# Altium footprint library connector.PcbLib: 207 footprints (part 5 of 13)
Each footprint in its own frame and in the unit in brackets; x right, y up, seen from the top. Pads: shape width x height; smd on the part's side, far side on the other; paste and mask are expansions set on the pad; w line width, h text height; cw(c..) or ccw(c..) is an arc to the next point about the centre after c.
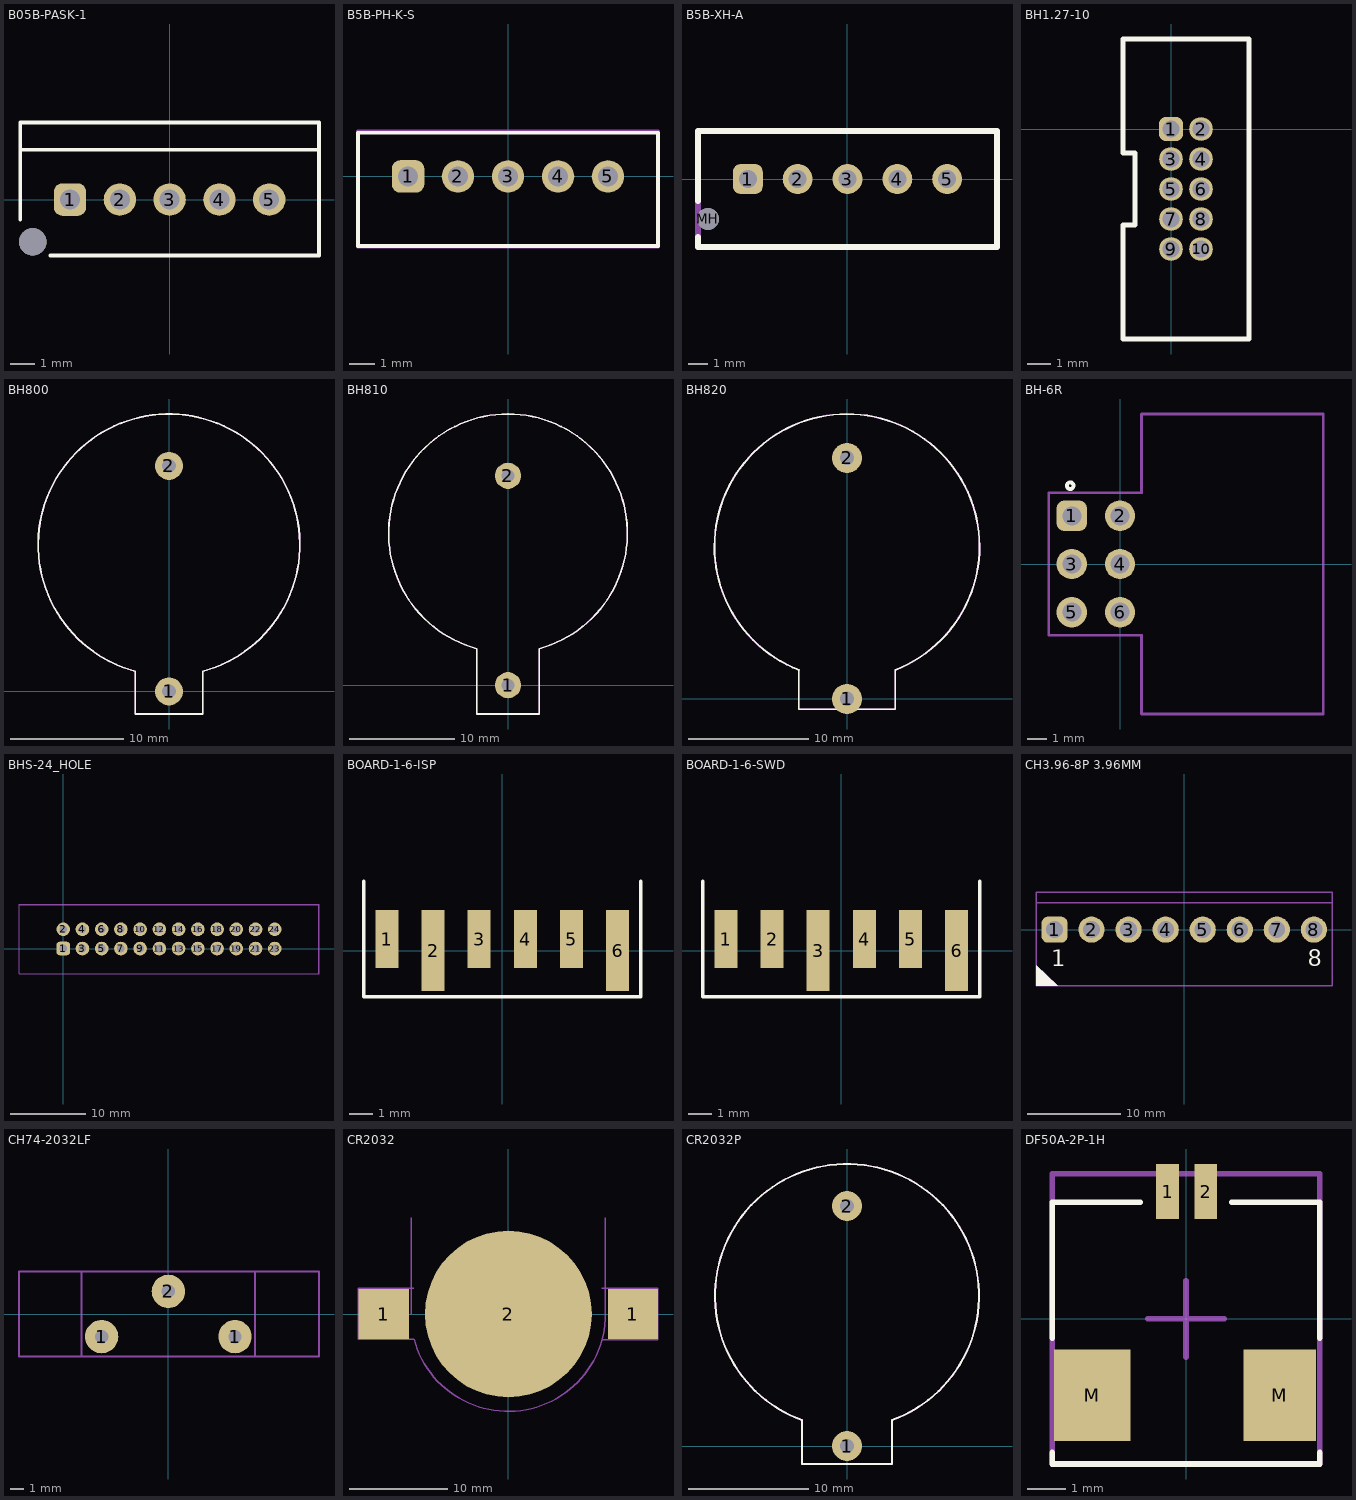
[diagram p4: the footprints below, top view; thin cyan lines are the x and y axes]

## B05B-PASK-1 [mm]
pads (6):
  rrect50% 1.3x1.3 hole 0.8: 1(-4,0)
  round 1.3 hole 0.8: 2(-2,0) 3(0,0) 4(2,0) 5(4,0)
  round 1.1 hole 1.1 unplated: ""(-5.5,-1.7)
Top Overlay:
  lines w0.15: -6,-0.8 -6,2 ; -4.8,-2.25 6,-2.25 6,2 ; -6,2 -6,3.1 0,3.1 6,3.1 6,2 ; -6,2 6,2
  text "." at -5,2.5 h0.1
3D body "B05B-PASK-1.STEP": height 7.85, standoff -2.85, extent -6,-2.2 6,3.1

## B5B-PH-K-S [mm]
pads (5):
  rrect50% 1.3x1.3 hole 0.8: 1(-4,0)
  round 1.3 hole 0.8: 2(-2,0) 3(0,0) 4(2,0) 5(4,0)
Top Overlay:
  lines w0.15: -6,-2.775 -6,1.75 6,1.75 6,-2.775 -6,-2.775
Top Courtyard:
  lines w0.15: -6,-2.8 6,-2.8 6,1.8 -6,1.8 -6,-2.8
3D body "B5B-PH-K-S.STEP": height 6, standoff -3.4, extent -5.95,-2.75 5.95,1.75

## B5B-XH-A [mm]
pads (6):
  rrect50% 1.5x1.5 hole 0.9: 1(-5,0)
  round 1.5 hole 0.9: 2(-2.5,0) 3(0,0) 4(2.5,0) 5(5,0)
  round 1.1 hole 1.1 unplated: MH(-7,-2)
Top Overlay:
  lines w0.3: -7.5,-2.9 -7.5,-3.4 7.5,-3.4 7.5,2.4 -7.5,2.4 -7.5,-1.1
Top Courtyard:
  lines w0.3: -7.5,-3.4 7.5,-3.4 7.5,2.4 -7.5,2.4 -7.5,-3.4
3D body "B5B-XH-A.STEP": height 7, standoff -3.4, extent -7.45,-3.375 7.45,2.375

## BH1.27-10 [mm] "BH1.27-10"
pads (10):
  rrect50% 1x1 hole 0.7: 1(0,0)
  round 1 hole 0.7: 2(1.27,0) 3(0,-1.27) 4(1.27,-1.27) 5(0,-2.54) 6(1.27,-2.54) 7(0,-3.81) 8(1.27,-3.81) 9(0,-5.08) 10(1.27,-5.08)
Top Overlay:
  lines w0.2: -2.032,-8.89 3.302,-8.89 3.302,3.81 -2.032,3.81 -2.032,-1.016 -1.524,-1.016 -1.524,-4.064 -2.032,-4.064 -2.032,-8.89
3D body "CONB127P-2R-10W_TH.STEP": height 5.4, standoff -2.1, extent -2.015,-8.865 3.185,3.785

## BH800 [mm]
height 6.6
pads (2):
  round 2.5 hole 1.2: 1(0,0) 2(0,20)
Top Overlay:
  lines w0.15: -3.001,1.795 cw(c0,13) 3.001,1.795 ; -3,1.8 -3,-2 3,-2 3,1.8
Top Courtyard:
  lines w0.15: -3.001,1.795 cw(c0,13) 3.001,1.795 ; -3,1.8 -3,-2 3,-2 3,1.8
3D body: height 8.2, standoff 0, extent -11.6,1.4 11.6,24.6
3D body: height 8.2, standoff 0, extent -3,-2 3,3.5

## BH810 [mm]
height 6.6
pads (2):
  round 2.5 hole 1.2: 1(0,0) 2(0,20)
Top Overlay:
  lines w0.15: -3,3.5 -3,-2.75 3,-2.75 3,3.5 ; -3,3.502 cw(c0,14.5) 3,3.502
Top Courtyard:
  lines w0.15: -3,3.5 -3,-2.75 3,-2.75 3,3.5 ; -3,3.502 cw(c0,14.5) 3,3.502
3D body "User Library-BATTERY HOLDER CR2032.step": height 7.41, standoff -3.5, extent -11.5,-2.75 11.5,25.75

## BH820 [mm]
height 6.6
pads (2):
  round 2.5 hole 1.2: 1(0,0) 2(0,20)
Top Overlay:
  lines w0.15: -4,2.35 -4,-0.85 4,-0.85 4,2.35 ; -3.982,2.396 cw(c0,12.65) 4.016,2.409
Top Courtyard:
  lines w0.15: -4,2.396 -4,-0.85 4,-0.85 4,2.396 ; -3.998,2.402 cw(c0,12.65) 3.998,2.402
3D body: height 8.5, standoff 0, extent -11.4,0.75 11.4,23.55
3D body: height 8.5, standoff 0, extent -4,-0.847 4,2.353

## BH-6R [mm] "BH-6R(IDC-6R)"
height 7
pads (6):
  rrect50% 1.6x1.6 hole 1: 1(-2.54,2.54)
  round 1.6 hole 1: 2(0,2.54) 3(-2.54,0) 4(0,0) 5(-2.54,-2.54) 6(0,-2.54)
Top Overlay:
  circle w0.2: c-2.625,4.125 r0.175
Top Courtyard:
  lines w0.15: -3.75,-3.75 1.125,-3.75 1.125,-7.9 10.7,-7.9 10.7,0 10.7,7.9 1.125,7.9 1.125,3.75 -3.75,3.75 -3.75,0 -3.75,-3.75
3D body "User Library-IDC Socket Male 6pin Angled THT Goldplated 2_54mm.step": height 8.85, standoff -2.5, extent -2.86,-7.93 10.7,7.93

## BHS-24_HOLE [mm]
pads (24):
  rrect50% 1.8x1.8 hole 1: 1(0,0)
  round 1.8 hole 1: 2(0,2.54) 3(2.54,0) 4(2.54,2.54) 5(5.08,0) 6(5.08,2.54) 7(7.62,0) 8(7.62,2.54) 9(10.16,0) 10(10.16,2.54) 11(12.7,0) 12(12.7,2.54) 13(15.24,0) 14(15.24,2.54) 15(17.78,0) 16(17.78,2.54) 17(20.32,0) 18(20.32,2.54) 19(22.86,0) 20(22.86,2.54) 21(25.4,0) 22(25.4,2.54) 23(27.94,0) 24(27.94,2.54)
Mechanical 29:
  circle w0.15: c0,0 r0.554
  lines w0.15: -5.842,-3.302 -5.842,5.842 33.782,5.842 33.782,-3.302 -5.842,-3.302 ; -5.8,-3.325 33.725,-3.325 33.725,5.8 -5.8,5.8 -5.8,-3.325
  text ".Designator" at 10.5,0.7 h1
3D body "IDC-24MS.STEP": height 9.1, standoff -3, extent -4.99,-3.275 33.09,6.325

## BOARD-1-6-ISP [mm]
pads (6):
  rect 1x2.5 smd: 1(-5,0.5) 3(-1,0.5) 4(1,0.5) 5(3,0.5)
  rect 1x3.5 smd: 2(-3,0) 6(5,0)
Top Overlay:
  lines w0.15: -6,3 -6,-2 6,-2 6,3

## BOARD-1-6-SWD [mm]
pads (6):
  rect 1x2.5 smd: 1(-5,0.5) 2(-3,0.5) 4(1,0.5) 5(3,0.5)
  rect 1x3.5 smd: 3(-1,0) 6(5,0)
Top Overlay:
  lines w0.15: -6,3 -6,-2 6,-2 6,3

## CH3.96-8P 3.96MM [mm]
height 22
pads (8):
  rrect50% 2.8x2.8 hole 1.8: 1(-13.86,0)
  round 2.8 hole 1.8: 2(-9.9,0) 3(-5.94,0) 4(-1.98,0) 5(1.98,0) 6(5.94,0) 7(9.9,0) 8(13.86,0)
Top Overlay:
  region: -15.84,-3.825 -15.84,-6 -13.525,-6
  text "1" at -14.225,-4.5 h3
  text "8" at 13.225,-4.5 h3
Mechanical 29:
  region: -15.84,-3.825 -15.84,-6 -13.525,-6
  lines w0.15: -15.84,-6 -15.84,4 ; -15.84,-6 0,-6 ; -15.84,-6 -15.84,4 ; -15.84,-6 0,-6 ; -15.84,4 0,4 ; -15.84,4 0,4 ; 0,-6 15.84,-6 ; 0,-6 15.84,-6 ; 0,4 15.84,4 ; 0,4 15.84,4 ; 15.84,-6 15.84,4 ; 15.84,-6 15.84,4 ; -15.84,2.875 15.875,2.875 -15.84,2.875
  text ".Designator" at -4,-1.8 h1
3D body "CH3.96-8P 3.96MM.STEP": height 13.5, standoff -4, extent -15.84,-6 15.84,4

## CH74-2032LF [mm]
height 18.1
pads (3):
  round 2.5 hole 1: 1(-5,-1.7) 1(5,-1.7) 2(0,1.7)
Mechanical 29:
  lines w0.15: -6.5,-3.2 -6.5,3.2 ; -6.5,-3.2 6.5,-3.2 ; -6.5,-3.2 6.5,-3.2 ; -6.5,-3.2 -6.5,3.2 ; -6.5,-3.2 -11.2,-3.2 -11.2,3.2 -6.5,3.2 ; -6.5,3.2 6.5,3.2 ; -6.5,3.2 6.5,3.2 ; 6.5,-3.2 6.5,3.2 ; 6.5,-3.2 6.5,3.2 ; 6.5,-3.2 11.3,-3.2 11.3,0 11.3,3.2 6.5,3.2
  text ".Designator" at -3.5,-0.3 h1
3D body "User Library-Battery holder CR 2032.step": height 18.2, standoff -2.9, extent -11.224,-3.225 11.275,3.175

## CR2032 [mm]
pads (3):
  rect 5.1x5.1 smd: 1(-12.7,0) 1(12.7,0)
  round 17 smd paste-16: 2(0,0)
Mechanical 29:
  lines w0.15: -9.9,0 -9.9,9.8 ; -9.65,-2.575 -15.325,-2.575 -15.325,2.625 -9.625,2.625 ; -9.613,-2.557 ccw(c-0.025,0) 9.898,0 9.898,9.8 ; 9.525,2.6 15.225,2.6 15.225,-2.6 9.55,-2.6 9.55,-2.675
  text ".Designator" at -3.5,-0.3 h1
3D body "Battery CR2032.stp": height 3.17, standoff -0.01, extent -10.108,-10.008 9.908,10.008
3D body "battery_holder.stp": height 3.96, standoff 0, extent -15.334,-10.3 15.4,9.753

## CR2032P [mm] "Top and Side Loading Coin Cell Holders"
pads (2):
  round 2.5 hole 1.2: 1(0,0) 2(0,20)
Top Overlay:
  lines w0.15: -3.759,2.162 cw(c0,12.5) 3.759,2.162 ; -3.75,2.162 -3.75,-1.5 3.75,-1.5 3.75,2.162
Mechanical 29:
  lines w0.15: -3.759,1.162 -3.75,1.162 ; -3.759,2.162 cw(c0,12.5) 3.759,2.162 ; -3.759,2.165 -3.759,-1.5 3.741,-1.5 3.741,2.165 ; 3.75,1.162 3.759,1.162
  text ".Designator" at -3.5,11.7 h1
3D body "User Library-CR2032_HOR_HOLD.step": height 8.5, standoff -4, extent -11,-1 11,23.5

## DF50A-2P-1H [mm]
height 7.05
pads (4):
  rect 0.6x1.44 smd: 1(-0.482,3.334) 2(0.518,3.334)
  rect 2x2.4 smd: M(-2.45,-2)
  rect 1.9x2.4 smd: M(2.45,-2)
Top Overlay:
  lines w0.15: -3.5,-3.5 -3.5,-3.8 3.5,-3.8 3.5,-3.5 ; -3.5,-0.5 -3.5,3.05 -1.2,3.05 ; 1.2,3.05 3.5,3.05 3.5,-0.5
  text "." at -1.5,3.5 h0.1
Mechanical 15:
  lines w0.15: -1,0 0,0 ; 0,-1 0,0 ; 0,1 0,0 ; 1,0 0,0 ; -3.5,-3.8 3.5,-3.8 3.5,3.8 -3.5,3.8 -3.5,-3.8
3D body "DF50A-2P-1H.stp": height 6.11, standoff 0.04, extent -3.355,-3.85 3.455,3.75